# Altium footprint library LC_SensorNode.PcbLib: 30 footprints (part 2 of 2)
Each footprint in its own frame and in the unit in brackets; x right, y up, seen from the top. Pads: shape width x height; smd on the part's side, far side on the other; paste and mask are expansions set on the pad; w line width, h text height; cw(c..) or ccw(c..) is an arc to the next point about the centre after c.
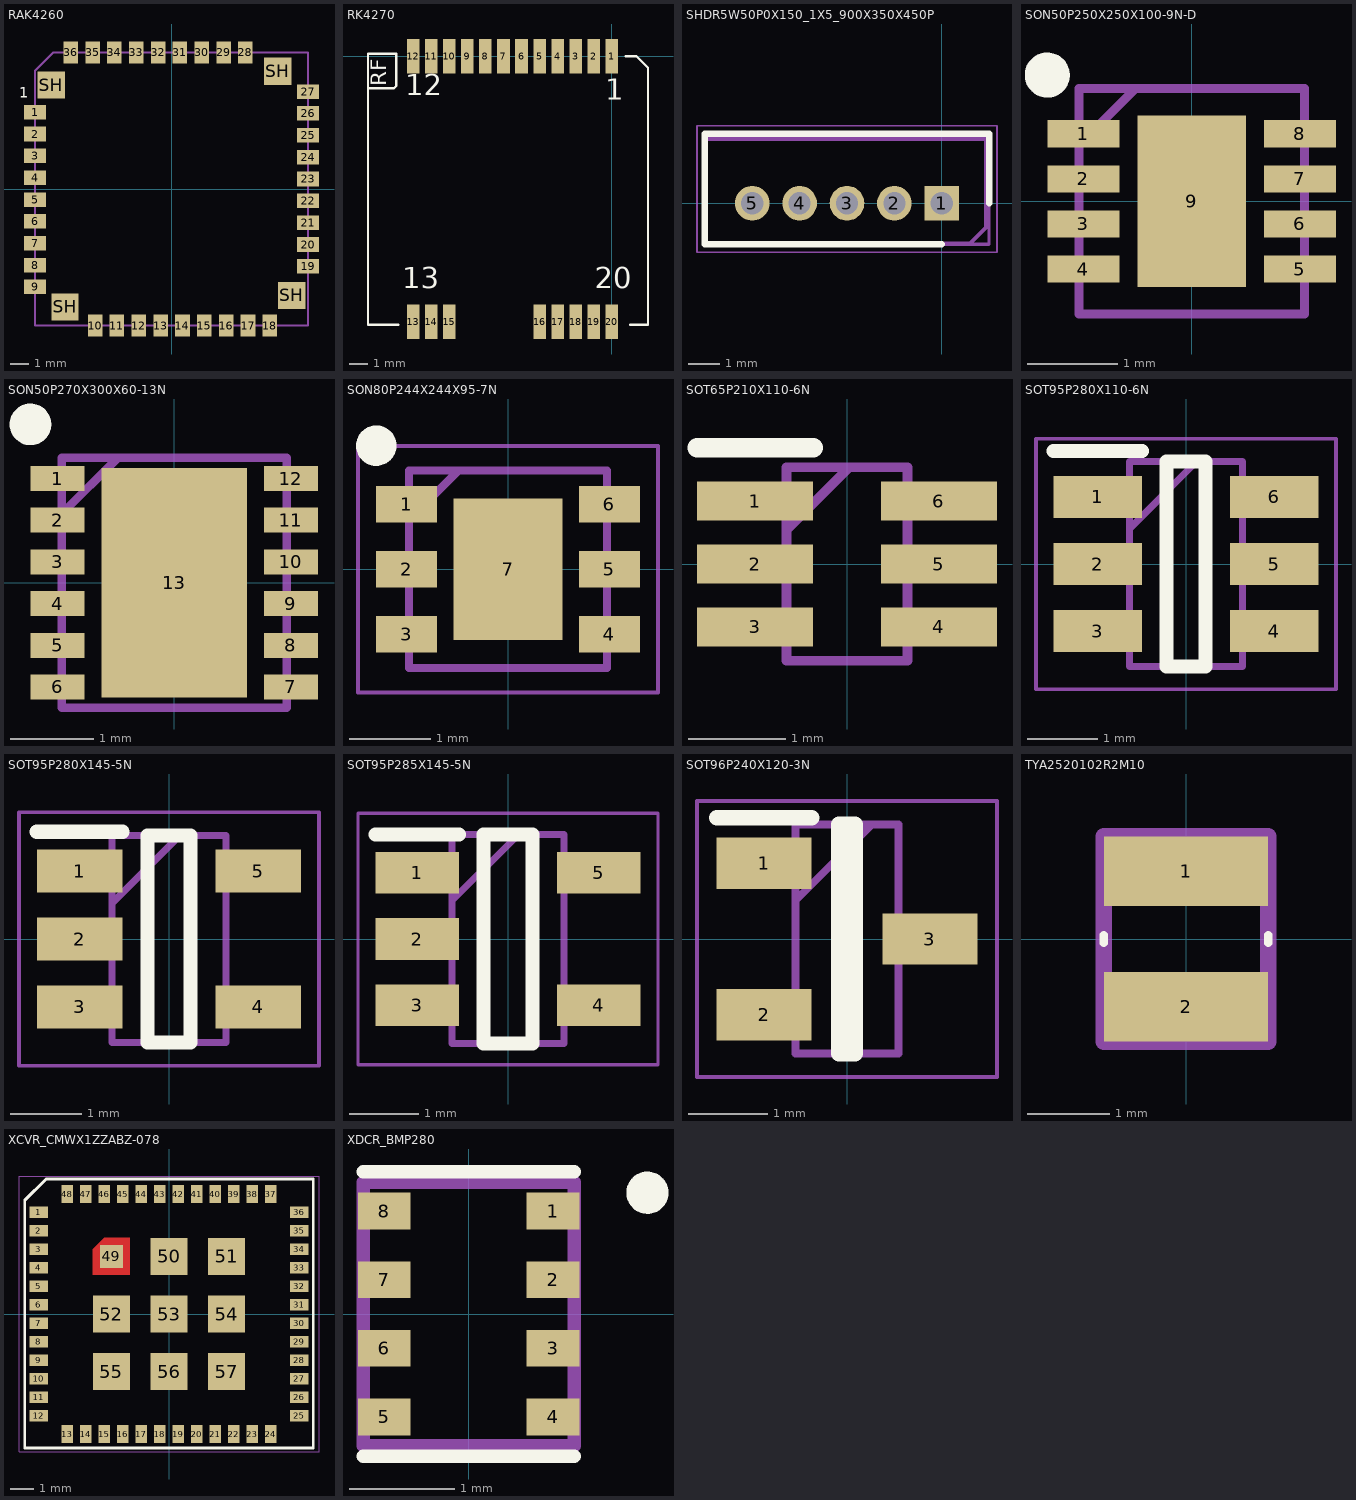
[diagram p1: the footprints below, top view; thin cyan lines are the x and y axes]

## RAK4260 [mil]
pads (40):
  rect 47.24x31.5 smd: 1(-295.28,166.14) 2(-295.28,118.9) 3(-295.28,71.65) 4(-295.28,24.41) 5(-295.28,-22.83) 6(-295.28,-70.08) 7(-295.28,-117.32) 8(-295.28,-164.57) 9(-295.28,-211.81) 19(295.28,-167.32) 20(295.28,-120.08) 21(295.28,-72.83) 22(295.28,-25.59) 23(295.28,21.65) 24(295.28,68.9) 25(295.28,116.14) 26(295.28,163.39) 27(295.28,210.63)
  rect 31.5x47.24 smd: 10(-165.35,-295.28) 11(-118.11,-295.28) 12(-70.87,-295.28) 13(-23.62,-295.28) 14(23.62,-295.28) 15(70.87,-295.28) 16(118.11,-295.28) 17(165.35,-295.28) 18(212.6,-295.28) 28(159.84,295.28) 29(112.6,295.28) 30(65.35,295.28) 31(18.11,295.28) 32(-29.13,295.28) 33(-76.38,295.28) 34(-123.62,295.28) 35(-170.87,295.28) 36(-218.11,295.28)
  rect 59.06x59.06 smd: SH(-260.24,224.8) SH(-230.32,-255.12) SH(229.53,254.72) SH(259.84,-230.32)
Top Overlay:
  text "1" at -330,190 h39.37
Top Designator (Mech29):
  lines w5: -295.28,-295.28 295.28,-295.28 295.28,295.28 -255.91,295.28 -295.28,255.91 -295.28,-295.28
  text ".Designator" at -80,-10 h39.37
3D body "RAK4260.STEP": height 62.5, standoff -0.49, extent -295.55,-295.55 295,295

## RK4270 [mm]
pads (20):
  rect 0.7x1.9 smd: 1(0,0) 2(-1,0) 3(-2,0) 4(-3,0) 5(-4,0) 6(-5,0) 7(-6,0) 8(-7,0) 9(-8,0) 10(-9,0) 11(-10,0) 12(-11,0) 13(-11,-14.7) 14(-10,-14.7) 15(-9,-14.7) 16(-4,-14.7) 17(-3,-14.7) 18(-2,-14.7) 19(-1,-14.7) 20(0,-14.7)
Top Overlay:
  lines w0.127: -13.462,-1.778 -12.065,-1.778 -11.938,-1.651 -11.938,0.127 -13.5,0.127 -13.5,-14.859 -11.811,-14.859 ; 0.762,0 1.365,0 2,-0.635 2,-14.351 2,-14.859 1.016,-14.859
  text "1" at -0.381,-2.794 h2
  text "12" at -11.43,-2.54 h2
  text "RF" at -12.192,-1.651 h1.5
  text "13" at -11.605,-13.217 h2
  text "20" at -0.937,-13.217 h2
3D body: height 2.5, standoff 0.25, extent -13.462,-14.859 2.032,0.127

## SHDR5W50P0X150_1X5_900X350X450P [mm]
pads (5):
  rect 1.1x1.1 hole 0.7: 1(0,0)
  round 1.1 hole 0.7: 2(-1.5,0) 3(-3,0) 4(-4.5,0) 5(-6,0)
Top Overlay:
  lines w0.2: 0,-1.3 -7.5,-1.3 -7.5,2.2 1.5,2.2 1.5,0
Mechanical 13:
  lines w0.1: -7.5,-1.3 -7.5,2.2 1.5,2.2 1.5,-1.3 -7.5,-1.3
Mechanical 15:
  lines w0.05: -7.75,-1.55 -7.75,2.45 1.75,2.45 1.75,-1.55 -7.75,-1.55
Top Designator (Mech29):
  lines w0.127: -7.493,-1.27 -7.493,2.032 1.397,2.032 1.397,-0.762 0.889,-1.27 -3.429,-1.27 -7.493,-1.27
  text ".Designator" at -4.953,0.254 h1
3D body "B5B-ZR.STEP": height 4.5, standoff -2.7, extent -7.548,-1.341 1.452,2.159

## SON50P250X250X100-9N-D [mm]
pads (9):
  rect 0.8x0.3 smd: 1(-1.2,0.75) 2(-1.2,0.25) 3(-1.2,-0.25) 4(-1.2,-0.75) 5(1.2,-0.75) 6(1.2,-0.25) 7(1.2,0.25) 8(1.2,0.75)
  rect 1.2x1.9 smd: 9(0,0)
Top Overlay:
  circle w0.25: c-1.6,1.4 r0.125
Mechanical 13:
  lines w0.1: -1.25,0.625 -0.625,1.25 ; -1.25,-1.25 1.25,-1.25 1.25,1.25 -1.25,1.25 -1.25,-1.25
Top Designator (Mech29):
  text ".Designator" at -2.286,-0.508 h1
3D body "SHT31-ARP-B2.5kS.stp": height 1, standoff 0, extent -1.3,-1.25 1.3,1.25

## SON50P270X300X60-13N [mm]
pads (13):
  rect 0.65x0.3 smd: 1(-1.4,1.25) 2(-1.4,0.75) 3(-1.4,0.25) 4(-1.4,-0.25) 5(-1.4,-0.75) 6(-1.4,-1.25) 7(1.4,-1.25) 8(1.4,-0.75) 9(1.4,-0.25) 10(1.4,0.25) 11(1.4,0.75) 12(1.4,1.25)
  rect 1.75x2.75 smd: 13(0,0)
Top Overlay:
  circle w0.25: c-1.725,1.9 r0.125
Top Designator (Mech29):
  lines w0.1: -1.35,0.825 -0.675,1.5 ; -1.35,-1.5 -1.35,1.5 1.35,1.5 1.35,-1.5 -1.35,-1.5
  text ".Designator" at -1.397,-0.635 h1
3D body "RP604K331A-TR.stp": height 0.6, standoff 0, extent -1.4,-1.5 1.4,1.5

## SON80P244X244X95-7N [mm]
pads (7):
  rect 0.75x0.45 smd: 1(-1.25,0.8) 2(-1.25,0) 3(-1.25,-0.8) 4(1.25,-0.8) 5(1.25,0) 6(1.25,0.8)
  rect 1.35x1.74 smd: 7(0,0)
Top Overlay:
  circle w0.25: c-1.625,1.525 r0.125
Mechanical 13:
  lines w0.1: -1.22,0.61 -0.61,1.22 ; -1.22,-1.22 1.22,-1.22 1.22,1.22 -1.22,1.22 -1.22,-1.22
Mechanical 15:
  lines w0.05: -1.85,-1.52 1.85,-1.52 1.85,1.52 -1.85,1.52 -1.85,-1.52
Top Designator (Mech29):
  text ".Designator" at -2.286,-0.381 h1
3D body "SGP40-D-R4.stp": height 0.95, standoff 0, extent -1.27,-1.22 1.27,1.22

## SOT65P210X110-6N [mm]
pads (6):
  rect 1.2x0.4 smd: 1(-0.95,0.65) 2(-0.95,0) 3(-0.95,-0.65) 4(0.95,-0.65) 5(0.95,0) 6(0.95,0.65)
Top Overlay:
  lines w0.2: -1.55,1.2 -0.35,1.2
Mechanical 13:
  lines w0.1: -0.625,0.35 0.025,1 ; -0.625,-1 -0.625,1 0.625,1 0.625,-1 -0.625,-1
Top Designator (Mech29):
  text ".Designator" at -1.778,-0.635 h1
3D body "TPS61221DCKT.stp": height 1.1, standoff 0, extent -1.05,-1 1.05,1

## SOT95P280X110-6N [mm]
pads (6):
  rect 1.25x0.6 smd: 1(-1.25,0.95) 2(-1.25,0) 3(-1.25,-0.95) 4(1.25,-0.95) 5(1.25,0) 6(1.25,0.95)
Top Overlay:
  lines w0.2: -1.875,1.6 -0.625,1.6 ; -0.275,-1.45 -0.275,1.45 0.275,1.45 0.275,-1.45 -0.275,-1.45
Mechanical 13:
  lines w0.1: -0.8,0.5 0.15,1.45 ; -0.8,-1.45 -0.8,1.45 0.8,1.45 0.8,-1.45 -0.8,-1.45
Mechanical 15:
  lines w0.05: -2.125,-1.775 -2.125,1.775 2.125,1.775 2.125,-1.775 -2.125,-1.775
Top Designator (Mech29):
  text ".Designator" at -2.413,-0.508 h1
3D body "TPL5110DDCR.stp": height 1.1, standoff 0, extent -1.4,-1.45 1.4,1.45

## SOT95P280X145-5N [mm]
pads (5):
  rect 1.2x0.6 smd: 1(-1.25,0.95) 2(-1.25,0) 3(-1.25,-0.95) 4(1.25,-0.95) 5(1.25,0.95)
Top Overlay:
  lines w0.2: -1.85,1.5 -0.65,1.5 ; -0.3,-1.45 -0.3,1.45 0.3,1.45 0.3,-1.45 -0.3,-1.45
Mechanical 13:
  lines w0.1: -0.8,0.5 0.15,1.45 ; -0.8,-1.45 -0.8,1.45 0.8,1.45 0.8,-1.45 -0.8,-1.45
Mechanical 15:
  lines w0.05: -2.1,-1.775 -2.1,1.775 2.1,1.775 2.1,-1.775 -2.1,-1.775
Top Designator (Mech29):
  text ".Designator" at -2.286,-0.508 h1
3D body "TPS613221ADBVR.stp": height 1.45, standoff 0, extent -1.4,-1.45 1.4,1.45

## SOT95P285X145-5N [mm]
pads (5):
  rect 1.2x0.6 smd: 1(-1.3,0.95) 2(-1.3,0) 3(-1.3,-0.95) 4(1.3,-0.95) 5(1.3,0.95)
Top Overlay:
  lines w0.2: -1.9,1.5 -0.7,1.5 ; -0.35,-1.5 -0.35,1.5 0.35,1.5 0.35,-1.5 -0.35,-1.5
Mechanical 13:
  lines w0.1: -0.8,0.55 0.15,1.5 ; -0.8,-1.5 -0.8,1.5 0.8,1.5 0.8,-1.5 -0.8,-1.5
Mechanical 15:
  lines w0.05: -2.15,-1.8 -2.15,1.8 2.15,1.8 2.15,-1.8 -2.15,-1.8
Top Designator (Mech29):
  text ".Designator" at -2.286,-0.381 h1
3D body "AP7335-33WG-7.stp": height 1.45, standoff 0, extent -1.425,-1.5 1.425,1.5

## SOT96P240X120-3N [mm]
pads (3):
  rect 1.2x0.65 smd: 1(-1.05,0.96) 2(-1.05,-0.96) 3(1.05,0)
Top Overlay:
  lines w0.2: -1.65,1.535 -0.45,1.535 ; -0.1,-1.45 0.1,-1.45 0.1,1.45 -0.1,1.45 -0.1,-1.45
Mechanical 13:
  lines w0.1: -0.65,0.49 0.31,1.45 ; -0.65,-1.45 0.65,-1.45 0.65,1.45 -0.65,1.45 -0.65,-1.45
Mechanical 15:
  lines w0.05: -1.9,-1.75 1.9,-1.75 1.9,1.75 -1.9,1.75 -1.9,-1.75
Top Designator (Mech29):
  text ".Designator" at -2.286,-0.381 h1
3D body "DMP3099L-7.stp": height 1.2, standoff 0, extent -1.2,-1.45 1.2,1.45

## TYA2520102R2M10 [mm]
pads (2):
  rect 2x0.85 smd: 1(0,0.825) 2(0,-0.825)
Top Overlay:
  lines w0.1: -1,-0.05 -1,0.05 ; 1,-0.05 1,0.05
Top Designator (Mech29):
  lines w0.2: -1,-1.25 -1,1.25 1,1.25 1,-1.25 -1,-1.25
  text ".Designator" at 0.381,-1.016 h1
3D body "TYA2520102R2M-10.stp": height 1.25, standoff 0, extent -1,-1.25 1,1.25

## XCVR_CMWX1ZZABZ-078 [mm]
pads (57):
  rect 0.8x0.5 smd: 1(-5.65,4.4) 2(-5.65,3.6) 3(-5.65,2.8) 4(-5.65,2) 5(-5.65,1.2) 6(-5.65,0.4) 7(-5.65,-0.4) 8(-5.65,-1.2) 9(-5.65,-2) 10(-5.65,-2.8) 11(-5.65,-3.6) 12(-5.65,-4.4) 25(5.65,-4.4) 26(5.65,-3.6) 27(5.65,-2.8) 28(5.65,-2) 29(5.65,-1.2) 30(5.65,-0.4) 31(5.65,0.4) 32(5.65,1.2) 33(5.65,2) 34(5.65,2.8) 35(5.65,3.6) 36(5.65,4.4)
  rect 0.5x0.8 smd: 13(-4.4,-5.2) 14(-3.6,-5.2) 15(-2.8,-5.2) 16(-2,-5.2) 17(-1.2,-5.2) 18(-0.4,-5.2) 19(0.4,-5.2) 20(1.2,-5.2) 21(2,-5.2) 22(2.8,-5.2) 23(3.6,-5.2) 24(4.4,-5.2) 37(4.4,5.2) 38(3.6,5.2) 39(2.8,5.2) 40(2,5.2) 41(1.2,5.2) 42(0.4,5.2) 43(-0.4,5.2) 44(-1.2,5.2) 45(-2,5.2) 46(-2.8,5.2) 47(-3.6,5.2) 48(-4.4,5.2)
  rect 1x1 smd: 49(-2.5,2.5)
  rect 1.6x1.6 smd: 50(0,2.5) 51(2.5,2.5) 52(-2.5,0) 53(0,0) 54(2.5,0) 55(-2.5,-2.5) 56(0,-2.5) 57(2.5,-2.5)
Top Layer:
  region: -1.7,1.7 -3.3,1.7 -3.3,2.8 -2.8,3.3 -1.7,3.3
Top Overlay:
  lines w0.127: -6.25,-5.8 -6.25,4.926 -5.334,5.842 6.25,5.842 6.25,-5.8 -6.25,-5.8
Top Paste:
  region: -1.7,1.7 -3.3,1.7 -3.3,2.8 -2.8,3.3 -1.7,3.3
Top Solder:
  region: -1.6,1.6 -3.4,1.6 -3.4,2.9 -2.9,3.4 -1.6,3.4
Mechanical 15:
  lines w0.05: -6.5,-5.975 6.5,-5.975 6.5,5.975 -6.5,5.975 -6.5,-5.975
Top Designator (Mech29):
  text ".Designator" at -3.048,-1.143 h1
3D body "CMWX1ZZABZ-078--3DModel-STEP-56544.STEP": height 1.76, standoff 0, extent -6.223,-5.885 6.277,5.715

## XDCR_BMP280 [mm]
pads (8):
  rect 0.5x0.35 smd: 1(0.8,0.975) 2(0.8,0.325) 3(0.8,-0.325) 4(0.8,-0.975) 5(-0.8,-0.975) 6(-0.8,-0.325) 7(-0.8,0.325) 8(-0.8,0.975)
Top Overlay:
  circle w0.2: c1.695,1.15 r0.1
  lines w0.127: -1,-1.35 1,-1.35 ; -1,1.35 1,1.35
Mechanical 13:
  lines w0.127: -1,-1.25 -1,1.25 1,1.25 1,-1.25 -1,-1.25
Top Designator (Mech29):
  text ".Designator" at 0.381,-2.413 h1
3D body "BMP280--3DModel-STEP-1.STEP": height 1, standoff 0, extent -1,-1.25 1,1.25